# Altium footprint library MPBoard.PcbLib: 123 footprints (part 1 of 8)
Each footprint in its own frame and in the unit in brackets; x right, y up, seen from the top. Pads: shape width x height; smd on the part's side, far side on the other; paste and mask are expansions set on the pad; w line width, h text height; cw(c..) or ccw(c..) is an arc to the next point about the centre after c.
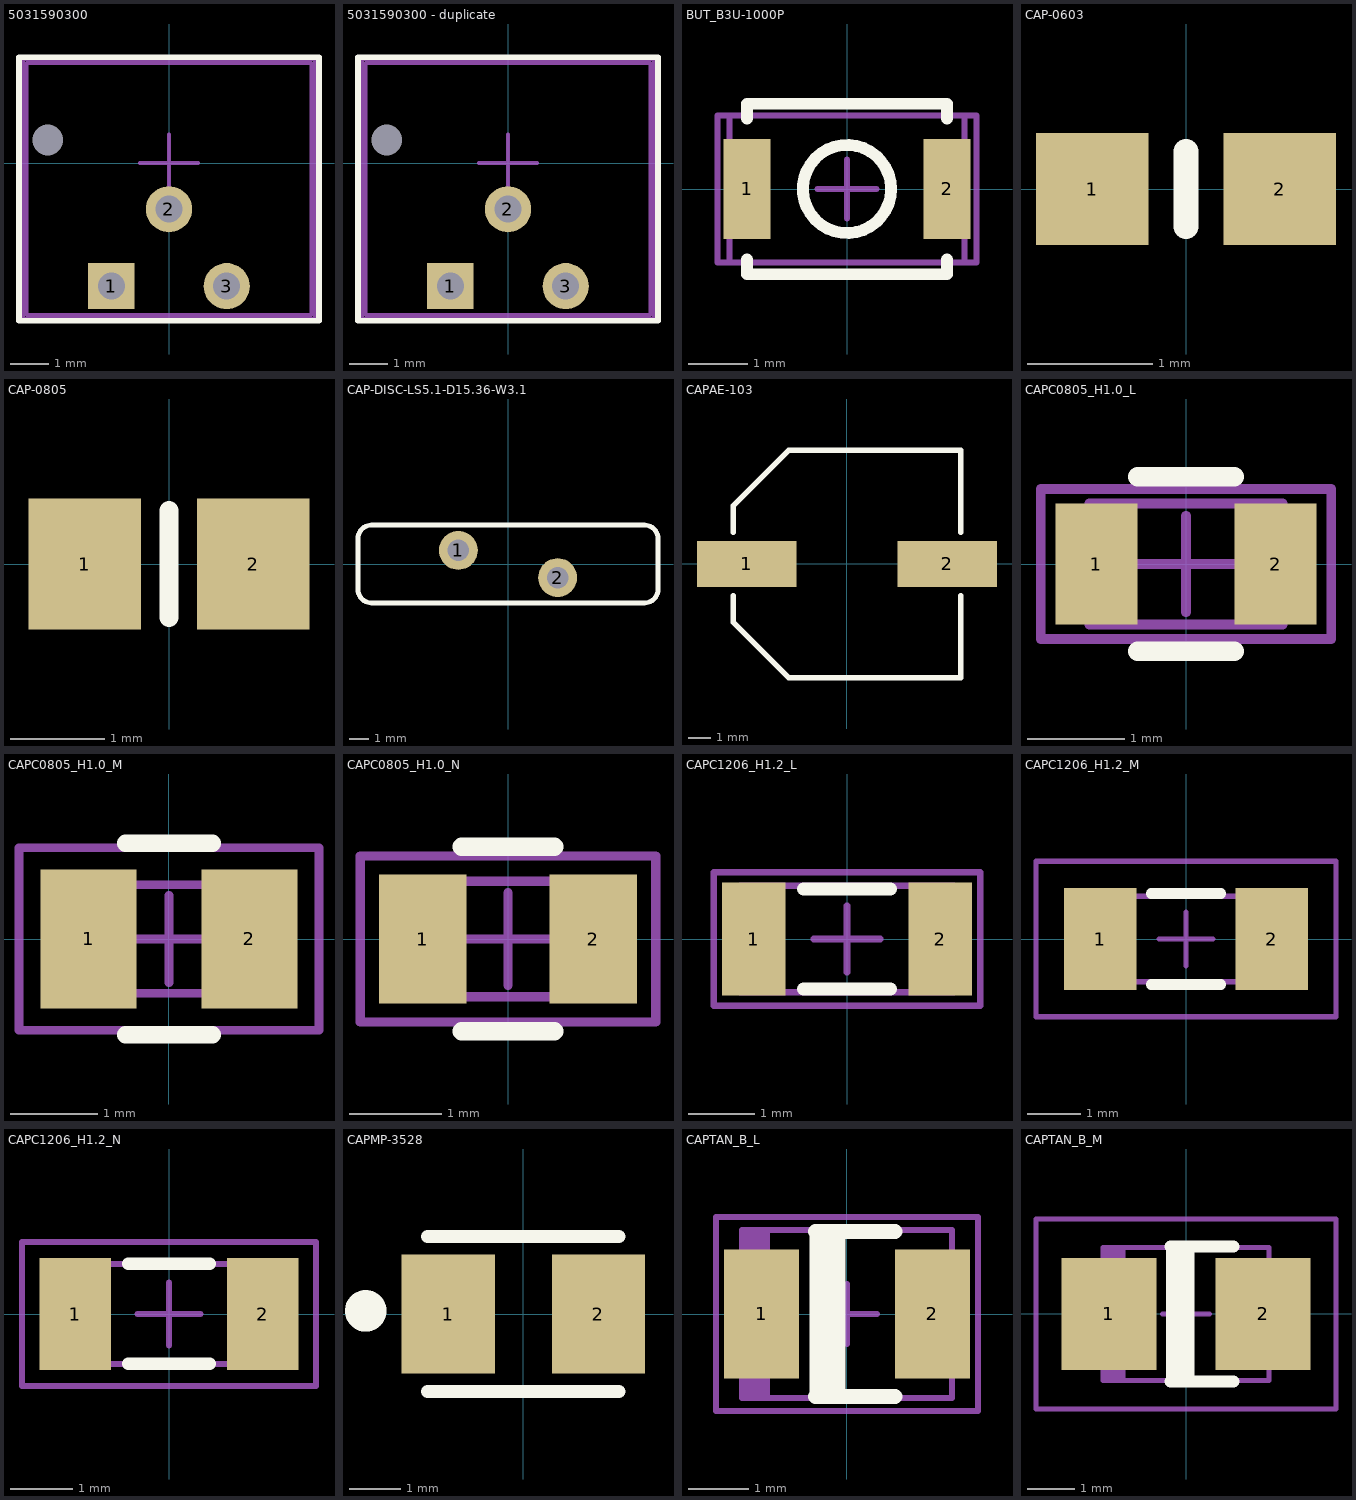
[diagram p0: the footprints below, top view; thin cyan lines are the x and y axes]

## 5031590300 [mm] "Molex"
pads (4):
  round 0 hole 0.8 unplated: 0(-3.15,0.6)
  rect 1.2x1.2 hole 0.7: 1(-1.5,-3.2)
  round 1.2 hole 0.7: 2(0,-1.2) 3(1.5,-3.2)
Top Overlay:
  lines w0.15: -3.9,-4.1 3.9,-4.1 3.9,2.75 -3.9,2.75 -3.9,-4.1
Top Component Outline:
  lines w0.1: -3.7,-3.95 -3.7,2.6 3.7,2.6 3.7,-3.95 -3.7,-3.95
Top Courtyard:
  lines w0.1: -0.75,0 0.75,0 ; 0,-0.75 0,0.75 ; -3.8,-4.05 3.8,-4.05 3.8,2.7 -3.8,2.7 -3.8,-4.05
3D body "5031590300.stp": height 7.98, standoff -3.37, extent -3.7,-3.95 3.7,2.6

## 5031590300 - duplicate [mm] "Molex"
pads (4):
  round 0 hole 0.8 unplated: 0(-3.15,0.6)
  rect 1.2x1.2 hole 0.7: 1(-1.5,-3.2)
  round 1.2 hole 0.7: 2(0,-1.2) 3(1.5,-3.2)
Top Overlay:
  lines w0.15: -3.9,-4.1 -3.9,2.75 3.9,2.75 3.9,-4.1 -3.9,-4.1
Top Component Outline:
  lines w0.1: -3.7,-3.95 3.7,-3.95 3.7,2.6 -3.7,2.6 -3.7,-3.95
Top Courtyard:
  lines w0.1: -0.75,0 0.75,0 ; 0,-0.75 0,0.75 ; -3.8,-4.05 -3.8,2.7 3.8,2.7 3.8,-4.05 -3.8,-4.05
3D body "5031590300.stp": height 7.98, standoff -3.37, extent -3.7,-3.95 3.7,2.6

## BUT_B3U-1000P [mm]
pads (2):
  rect 0.8x1.7 smd: 1(-1.7,0) 2(1.7,0)
Top Overlay:
  circle w0.2: c0,0 r0.75
  lines w0.2: -1.7,-1.2 -1.7,-1.45 0,-1.45 1.7,-1.45 1.7,-1.2 ; -1.7,1.2 -1.7,1.45 0,1.45 1.7,1.45 1.7,1.2
Top Component Outline:
  lines w0.1: -2,-1.25 2,-1.25 2,1.25 -2,1.25 -2,-1.25
Top Courtyard:
  lines w0.1: -0.5,0 0.5,0 ; 0,-0.5 0,0.5 ; -2.2,-1.25 2.2,-1.25 2.2,1.25 -2.2,1.25 -2.2,-1.25
3D body "User Library-OMRON B3U1000P.step": height 1.6, standoff 0, extent -2,-1.25 2,1.25

## CAP-0603 [mm]
pads (2):
  rect 0.9x0.9 smd: 1(-0.75,0) 2(0.75,0)
Top Overlay:
  lines w0.2: 0,-0.3 0,0.3
3D body "CAP-0603.STEP": height 0.9, standoff 0, extent -0.8,-0.4 0.8,0.4

## CAP-0805 [mm]
pads (2):
  rect 1.2x1.4 smd: 1(-0.9,0) 2(0.9,0)
Top Overlay:
  lines w0.2: 0,-0.57 0,0.57
3D body "CAP-0805.STEP": height 1.3, standoff 0, extent -1,-0.625 1,0.625

## CAP-DISC-LS5.1-D15.36-W3.1 [mm]
pads (2):
  round 2 hole 1.1: 1(-2.55,0.7) 2(2.55,-0.7)
Top Overlay:
  lines w0.25: -7.7,-1.3 ccw(c-7,-1.3) -7,-2 7,-2 ccw(c7,-1.3) 7.7,-1.3 7.7,1.3 ccw(c7,1.3) 7,2 -7,2 ccw(c-7,1.3) -7.7,1.3 -7.7,-1.3
3D body "cap-disc-ls5_1-d15_3w3_1.prt.stp": height 17.86, standoff -2.5, extent -7.68,-1.557 7.68,1.543

## CAPAE-103 [mm]
pads (2):
  rect 4.5x2.1 smd: 1(-4.55,0) 2(4.55,0)
Top Overlay:
  lines w0.25: -5.15,-1.45 -5.15,-2.65 -2.65,-5.15 5.15,-5.15 5.15,-1.45 ; -5.15,1.45 -5.15,2.65 -2.65,5.15 5.15,5.15 5.15,1.45
3D body "CAPAE-103.STEP": height 10, standoff 0, extent -5.5,-5.15 5.5,5.15

## CAPC0805_H1.0_L [mm] "Chip Capacitor, 2-Leads, Body 2,00x1,25mm, IPC High Density"
height 1
pads (2):
  rect 0.85x1.25 smd: 1(-0.925,0) 2(0.925,0)
Top Overlay:
  lines w0.2: -0.5,-0.9 0.5,-0.9 ; -0.5,0.9 0.5,0.9
Top Component Outline:
  lines w0.1: -1,-0.625 -1,0.625 1,0.625 1,-0.625 -1,-0.625
Top Courtyard:
  lines w0.1: -0.5,0 0.5,0 ; 0,-0.5 0,0.5 ; -1.5,-0.775 -1.5,0.775 1.5,0.775 1.5,-0.775 -1.5,-0.775
3D body "CAPC2012X10L.step": height 1, standoff 0, extent -1,-0.625 1,0.625

## CAPC0805_H1.0_M [mm] "Chip Capacitor, 2-Leads, Body 2,00x1,25mm, IPC Low Density"
height 1
pads (2):
  rect 1.1x1.6 smd: 1(-0.925,0) 2(0.925,0)
Top Overlay:
  lines w0.2: -0.5,-1.1 0.5,-1.1 ; -0.5,1.1 0.5,1.1
Top Component Outline:
  lines w0.1: -1,-0.625 1,-0.625 1,0.625 -1,0.625 -1,-0.625
Top Courtyard:
  lines w0.1: -0.5,0 0.5,0 ; 0,-0.5 0,0.5 ; -1.725,-1.05 -1.725,1.05 1.725,1.05 1.725,-1.05 -1.725,-1.05
3D body "CAPC2012X10M.step": height 1, standoff 0, extent -1,-0.625 1,0.625

## CAPC0805_H1.0_N [mm] "Chip Capacitor, 2-Leads, Body 2,00x1,25mm, IPC Medium Density"
height 1
pads (2):
  rect 0.95x1.4 smd: 1(-0.925,0) 2(0.925,0)
Top Overlay:
  lines w0.2: -0.5,-1 0.5,-1 ; -0.5,1 0.5,1
Top Component Outline:
  lines w0.1: -1,-0.625 1,-0.625 1,0.625 -1,0.625 -1,-0.625
Top Courtyard:
  lines w0.1: -0.5,0 0.5,0 ; 0,-0.5 0,0.5 ; -1.6,-0.9 1.6,-0.9 1.6,0.9 -1.6,0.9 -1.6,-0.9
3D body "CAPC2012X10N.step": height 1, standoff 0, extent -1,-0.625 1,0.625

## CAPC1206_H1.2_L [mm] "Chip Capacitor, 2-Leads, Body 3,20x1,60mm, IPC High Density"
height 1.2
pads (2):
  rect 0.95x1.7 smd: 1(-1.4,0) 2(1.4,0)
Top Overlay:
  lines w0.2: -0.65,-0.75 0.65,-0.75 ; -0.65,0.75 0.65,0.75
Top Component Outline:
  lines w0.1: -1.6,-0.8 1.6,-0.8 1.6,0.8 -1.6,0.8 -1.6,-0.8
Top Courtyard:
  lines w0.1: -0.5,0 0.5,0 ; 0,-0.5 0,0.5 ; -2,-1 2,-1 2,1 -2,1 -2,-1
3D body "CAPC3216X12L.step": height 1.2, standoff 0, extent -1.6,-0.8 1.6,0.8

## CAPC1206_H1.2_M [mm] "Chip Capacitor, 2-Leads, Body 3,20x1,60mm, IPC Low Density"
height 1.2
pads (2):
  rect 1.35x1.9 smd: 1(-1.6,0) 2(1.6,0)
Top Overlay:
  lines w0.2: -0.65,-0.85 0.65,-0.85 ; -0.65,0.85 0.65,0.85
Top Component Outline:
  lines w0.1: -1.6,-0.8 1.6,-0.8 1.6,0.8 -1.6,0.8 -1.6,-0.8
Top Courtyard:
  lines w0.1: -0.5,0 0.5,0 ; 0,-0.5 0,0.5 ; -2.8,-1.45 2.8,-1.45 2.8,1.45 -2.8,1.45 -2.8,-1.45
3D body "CAPC3216X12M.step": height 1.2, standoff 0, extent -1.6,-0.8 1.6,0.8

## CAPC1206_H1.2_N [mm] "Chip Capacitor, 2-Leads, Body 3,20x1,60mm, IPC Medium Density"
height 1.2
pads (2):
  rect 1.15x1.8 smd: 1(-1.5,0) 2(1.5,0)
Top Overlay:
  lines w0.2: -0.65,-0.8 0.65,-0.8 ; -0.65,0.8 0.65,0.8
Top Component Outline:
  lines w0.1: -1.6,-0.8 1.6,-0.8 1.6,0.8 -1.6,0.8 -1.6,-0.8
Top Courtyard:
  lines w0.1: -0.5,0 0.5,0 ; 0,-0.5 0,0.5 ; -2.35,-1.15 2.35,-1.15 2.35,1.15 -2.35,1.15 -2.35,-1.15
3D body "CAPC3216X12N.step": height 1.2, standoff 0, extent -1.6,-0.8 1.6,0.8

## CAPMP-3528 [mm]
pads (2):
  rect 1.8x2.3 smd: 1(-1.45,0) 2(1.45,0)
Top Overlay:
  circle w0.5: c-3.04,0.06 r0.15
  lines w0.25: -1.85,-1.5 1.85,-1.5 ; -1.85,1.5 1.85,1.5
3D body "CAPMP-3528.STEP": height 1.93, standoff 0, extent -1.75,-1.4 1.75,1.4

## CAPTAN_B_L [mm]
height 1.9
pads (2):
  rect 1.25x2.15 smd: 1(-1.425,0) 2(1.425,0)
Top Overlay:
  rectangle: -0.625,-1.4 -0.025,1.375
  lines w0.254: -0.525,-1.375 0.8,-1.375 ; -0.525,1.375 0.8,1.375
Top Component Outline:
  rectangle: -1.75,-1.4 -1.279,1.4
  lines w0.1: -1.75,-1.4 1.75,-1.4 1.75,1.4 -1.75,1.4 -1.75,-1.4
Top Courtyard:
  lines w0.1: -0.5,0 0.5,0 ; 0,-0.5 0,0.5 ; -2.18,-1.62 2.18,-1.62 2.18,1.62 -2.18,1.62 -2.18,-1.62
3D body "tantal_case_B.step": height 1.9, standoff 0, extent -1.75,-1.4 1.75,1.4

## CAPTAN_B_M [mm]
height 1.9
pads (2):
  rect 2x2.35 smd: 1(-1.625,0) 2(1.625,0)
Top Overlay:
  rectangle: -0.425,-1.425 0.175,1.425
  lines w0.254: -0.325,-1.425 1,-1.425 ; -0.325,1.425 1,1.425
Top Component Outline:
  rectangle: -1.75,-1.4 -1.279,1.4
  lines w0.1: -1.75,-1.4 -1.75,1.4 1.75,1.4 1.75,-1.4 -1.75,-1.4
Top Courtyard:
  lines w0.1: -0.5,0 0.5,0 ; 0,-0.5 0,0.5 ; -3.16,-2 -3.16,2 3.16,2 3.16,-2 -3.16,-2
3D body "tantal_case_B.step": height 1.9, standoff 0, extent -1.75,-1.4 1.75,1.4